# Altium footprint library 20.Optical.PcbLib: 40 footprints (part 3 of 3)
Each footprint in its own frame and in the unit in brackets; x right, y up, seen from the top. Pads: shape width x height; smd on the part's side, far side on the other; paste and mask are expansions set on the pad; w line width, h text height; cw(c..) or ccw(c..) is an arc to the next point about the centre after c.
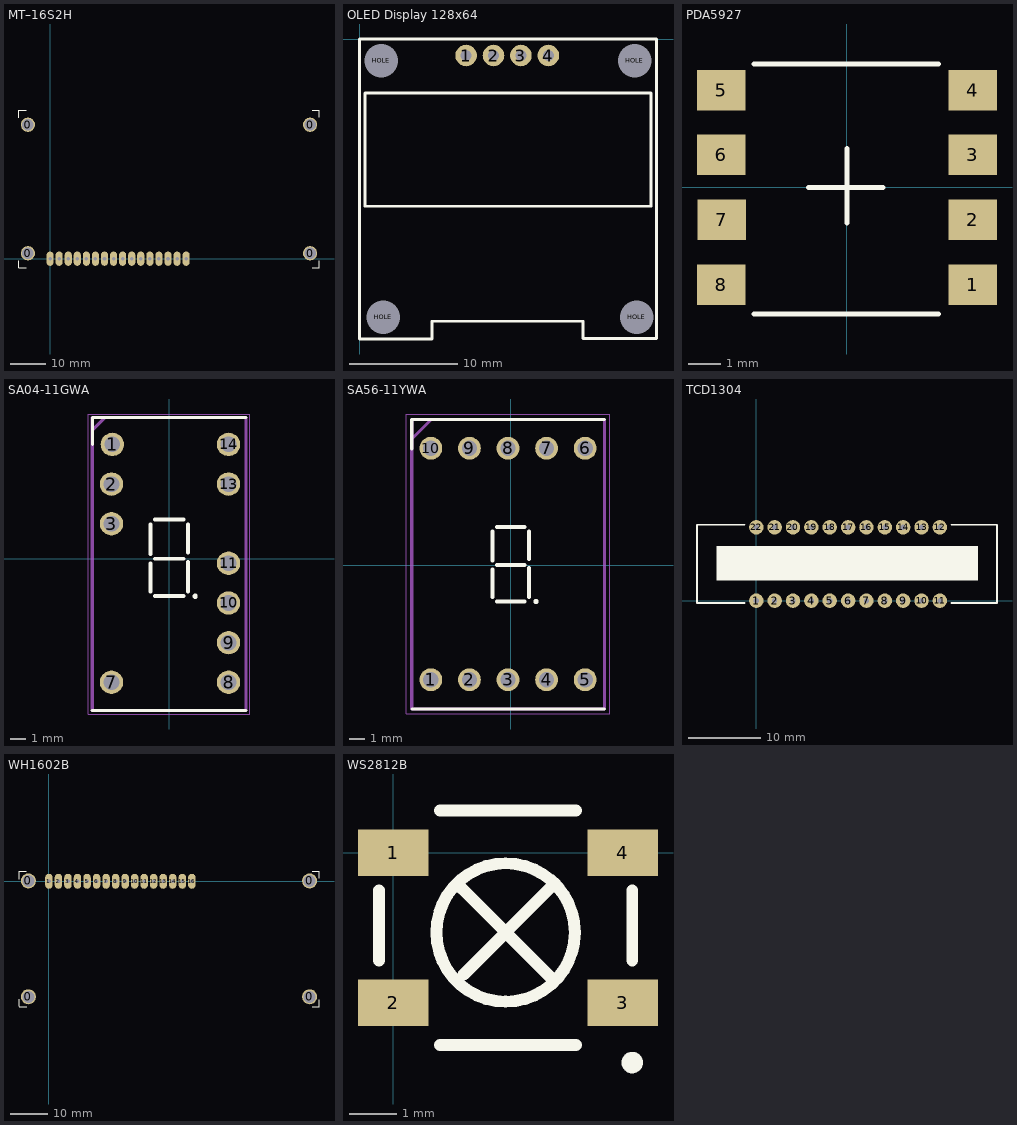
[diagram p2: the footprints below, top view; thin cyan lines are the x and y axes]

## MT–16S2H [mm]
pads (20):
  round 4 hole 3.2: 0(-6.2,1.5) 0(-6.2,37.5) 0(72.8,1.5) 0(72.8,37.5)
  oval 2x4 hole 1: 1(33.02,0) 2(30.48,0) 3(27.94,0) 4(25.4,0) 5(22.86,0) 6(20.32,0) 7(17.78,0) 8(15.24,0) 9(12.7,0) 10(10.16,0) 11(7.62,0) 12(5.08,0) 13(2.54,0) 14(0,0) 15(38.1,0) 16(35.56,0)
Top Overlay:
  lines w0.254: -8.7,-0.646 -8.7,-2.5 -6.643,-2.5 ; -8.7,39.417 -8.7,41.5 -6.719,41.5 ; 73.446,-2.5 75.3,-2.5 75.3,-0.646 ; 73.446,41.5 75.3,41.5 75.3,39.646
3D body "User Library-LCD-3.step": height 20.5, standoff 7, extent -8.7,-2.5 75.3,41.5

## OLED Display 128x64 [mm]
pads (8):
  round 2 hole 1: 1(9.87,-1.53) 2(12.41,-1.53) 3(14.95,-1.53) 4(17.49,-1.53)
  round 2 hole 3.1: HOLE(2,-2) HOLE(2.2,-25.8) HOLE(25.5,-2) HOLE(25.7,-25.8)
Top Overlay:
  lines w0.254: 0.25,0 0,0 ; 20.7,-27.75 27.475,-27.75 ; 20.7,-27.65 20.7,-26.15 6.7,-26.15 6.7,-27.8 0,-27.8 0,0 ; 27.5,-27.75 27.5,0 0,0 ; 0.5,-15.5 0.5,-5 27,-5 27,-15.5 0.5,-15.5
3D body "128x64Oled.step": height 10, standoff -1.25, extent 0.2,-27.55 27.2,-0.05

## PDA5927 [mm]
pads (8):
  rect 1.5x1.25 smd: 1(3.876,-3) 2(3.876,-0.999) 3(3.876,1) 4(3.876,3) 5(-3.876,3) 6(-3.874,1) 7(-3.862,-0.999) 8(-3.874,-3)
Top Overlay:
  lines w0.15: -2.874,-3.9 2.826,-3.9 ; -2.874,3.8 2.826,3.8 ; -1.188,0 1.112,0 ; 0.001,-1.1 0.001,1.2
3D body: height 1.2, standoff 0, extent -3.924,-3.95 3.826,3.8
3D body: height 1.5, standoff 0, extent -2.246,-2.183 -0.008,-0.008
3D body: height 1.5, standoff 0, extent 0.031,-2.178 2.269,-0.003
3D body: height 1.5, standoff 0, extent 0.031,0.022 2.269,2.197
3D body: height 1.5, standoff 0, extent -2.242,0.021 -0.004,2.196

## SA04-11GWA [mm]
pads (10):
  round 1.5 hole 1: 1(-3.642,7.325) 2(-3.7,4.785) 3(-3.7,2.245) 7(-3.7,-7.915) 8(3.8,-7.915) 9(3.8,-5.375) 10(3.8,-2.835) 11(3.8,-0.295) 13(3.8,4.785) 14(3.8,7.325)
Top Overlay:
  circle w0.254: c1.66,-2.4 r0.04
  lines w0.2: -4.93,-9.725 4.925,-9.725 ; -4.925,7.325 -4.925,9.05 4.925,9.05
  lines w0.254: -1.2,-2.1 -1.2,-0.3 ; -1.2,0.3 -1.2,2.2 ; -0.9,-2.4 0.9,-2.4 ; -0.9,0 0.9,0 ; -0.9,2.5 0.9,2.5 ; 1.2,-2.1 1.2,-0.2 ; 1.2,0.4 1.2,2.2
Mechanical 13:
  lines w0.2: -4.925,8.225 -4.125,9.025 ; -4.93,-9.725 -4.93,9.045 4.925,9.045 4.925,-9.725 -4.93,-9.725
Mechanical 15:
  lines w0.05: -5.18,-9.95 -5.18,9.275 5.15,9.275 5.15,-9.95 -5.175,-9.95
3D body "SA04-11GWA.step": height 7.99, standoff -2.09, extent -4.9,-9.675 4.9,9.075

## SA56-11YWA [mm]
pads (10):
  round 1.5 hole 1: 1(-5.267,-7.55) 2(-2.727,-7.55) 3(-0.187,-7.55) 4(2.353,-7.55) 5(4.893,-7.55) 6(4.893,7.69) 7(2.353,7.69) 8(-0.187,7.69) 9(-2.727,7.69) 10(-5.267,7.69)
Top Overlay:
  circle w0.254: c1.66,-2.4 r0.04
  lines w0.2: -6.525,7.65 -6.525,9.575 6.15,9.575 ; -6.5,-9.475 6.175,-9.475
  lines w0.254: -1.2,-2.1 -1.2,-0.3 ; -1.2,0.3 -1.2,2.2 ; -0.9,-2.4 0.9,-2.4 ; -0.9,0 0.9,0 ; -0.9,2.5 0.9,2.5 ; 1.2,-2.1 1.2,-0.2 ; 1.2,0.4 1.2,2.2
Mechanical 13:
  lines w0.2: -6.525,8.305 -5.255,9.575 ; -6.525,-9.475 6.175,-9.475 6.175,9.575 -6.525,9.575 -6.525,-9.475
Mechanical 15:
  lines w0.05: -6.875,-9.805 -6.875,9.945 6.5,9.945 6.5,-9.805 -6.875,-9.805
3D body "SA56-11YWA.step": height 7.99, standoff -4.01, extent -6.537,-9.455 6.163,9.595

## TCD1304 [mm]
pads (22):
  round 2 hole 0.7: 1(0,0) 2(2.54,0) 3(5.08,0) 4(7.62,0) 5(10.16,0) 6(12.7,0) 7(15.24,0) 8(17.78,0) 9(20.32,0) 10(22.86,0) 11(25.4,0) 12(25.4,10.16) 13(22.86,10.16) 14(20.32,10.16) 15(17.78,10.16) 16(15.24,10.16) 17(12.7,10.16) 18(10.16,10.16) 19(7.62,10.16) 20(5.08,10.16) 21(2.54,10.16) 22(0,10.16)
Top Overlay:
  rectangle: -5.5,2.8 30.7,7.6
  lines w0.254: -1.6,-0.3 -8.2,-0.3 -8.2,10.5 -1.7,10.5 -1.6,10.5 ; 27,-0.3 33.3,-0.3 33.3,10.5 27,10.5
3D body "User Library-TCD1304.STEP": height 3.72, standoff -3.51, extent -8.2,-0.28 33.4,10.48

## WH1602B [mm]
pads (20):
  round 4 hole 3.2: 0(-5.48,-30.8) 0(-5.48,0.1) 0(69.52,-30.8) 0(69.52,0.1)
  oval 2x4 hole 1: 1(0,0) 2(2.54,0) 3(5.08,0) 4(7.62,0) 5(10.16,0) 6(12.7,0) 7(15.24,0) 8(17.78,0) 9(20.32,0) 10(22.86,0) 11(25.4,0) 12(27.94,0) 13(30.48,0) 14(33.02,0) 15(35.56,0) 16(38.1,0)
Top Overlay:
  lines w0.254: -7.98,-33.4 -5.923,-33.4 ; -7.98,-33.3 -7.98,-31.446 ; -7.98,0.517 -7.98,2.6 -5.999,2.6 ; 70.166,-33.4 72.02,-33.4 72.02,-31.546 ; 70.166,2.6 72.02,2.6 72.02,0.746
3D body "User Library-Winstar WH1602B-1.step": height 15.2, standoff 2.2, extent -7.98,-33.5 72.02,2.5

## WS2812B [mm]
pads (4):
  rect 1.5x1 smd: 1(0,0) 2(0,-3.2) 3(4.9,-3.2) 4(4.9,0)
Top Overlay:
  circle w0.254: c5.1,-4.475 r0.103
  circle w0.254: c2.4,-1.7 r1.476
  lines w0.254: -0.3,-2.3 -0.3,-0.8 ; 1,-4.1 3.9,-4.1 ; 1,0.9 3.9,0.9 ; 1.45,-0.75 3.4,-2.7 ; 1.5,-2.6 3.45,-0.65 ; 5.1,-2.3 5.1,-0.8
3D body "User Library-ws2812B-1.step": height 1.6, standoff 0.03, extent -0.3,-4.1 5.1,0.9